# Altium footprint library 6-Connectors-4.PcbLib: 166 footprints (part 2 of 12) (continued)
## ERNI_064318 [mm] "12 Contacts Pitch 1.27  SMC Vertical Female Connector Type B" (continued)
  text "a6" at -3.925,2.35 h0.9
  text "b6" at -3.925,-3.575 h0.9
  text "b1" at 4.8,-3.275 h0.9
  text "a1" at 4.8,2.375 h0.9
Mechanical 8:
  lines w0.1: -6.685,-2.55 -5.685,-2.55 ; -6.685,2.55 -5.685,2.55 ; -6.385,0 -5.385,0 ; -5.685,-3.55 -5.685,-2.55 ; -5.685,-1.55 -5.685,-2.55 ; -5.685,1.55 -5.685,2.55 ; -5.685,3.55 -5.685,2.55 ; -5.385,-1 -5.385,0 ; -5.385,1 -5.385,0 ; -4.685,-2.55 -5.685,-2.55 ; -4.685,2.55 -5.685,2.55 ; -4.385,0 -5.385,0 ; -3.575,-3.3 -3.175,-2.75 ; -3.575,-2.2 -3.175,-2.75 ; -3.575,2.2 -3.175,2.75 ; -3.575,3.3 -3.175,2.75 ; -2.775,-3.3 -3.175,-2.75 ; -2.775,-2.2 -3.175,-2.75 ; -2.775,2.2 -3.175,2.75 ; -2.775,3.3 -3.175,2.75 ; -2.305,-3.3 -1.905,-2.75 ; -2.305,-2.2 -1.905,-2.75 ; -2.305,2.2 -1.905,2.75 ; -2.305,3.3 -1.905,2.75 ; -1.505,-3.3 -1.905,-2.75 ; -1.505,-2.2 -1.905,-2.75 ; -1.505,2.2 -1.905,2.75 ; -1.505,3.3 -1.905,2.75 ; -1.035,-3.3 -0.635,-2.75 ; -1.035,-2.2 -0.635,-2.75 ; -1.035,2.2 -0.635,2.75 ; -1.035,3.3 -0.635,2.75 ; -1,0 0,0 ; -0.235,-3.3 -0.635,-2.75 ; -0.235,-2.2 -0.635,-2.75 ; -0.235,2.2 -0.635,2.75 ; -0.235,3.3 -0.635,2.75 ; 0,-1 0,0 ; 0,1 0,0 ; 0.235,-3.3 0.635,-2.75 ; 0.235,-2.2 0.635,-2.75 ; 0.235,2.2 0.635,2.75 ; 0.235,3.3 0.635,2.75 ; 1,0 0,0 ; 1.035,-3.3 0.635,-2.75 ; 1.035,-2.2 0.635,-2.75 ; 1.035,2.2 0.635,2.75 ; 1.035,3.3 0.635,2.75 ; 1.505,-3.3 1.905,-2.75 ; 1.505,-2.2 1.905,-2.75 ; 1.505,2.2 1.905,2.75 ; 1.505,3.3 1.905,2.75 ; 2.305,-3.3 1.905,-2.75 ; 2.305,-2.2 1.905,-2.75 ; 2.305,2.2 1.905,2.75 ; 2.305,3.3 1.905,2.75 ; 2.775,-3.3 3.175,-2.75 ; 2.775,-2.2 3.175,-2.75 ; 2.775,2.2 3.175,2.75 ; 2.775,3.3 3.175,2.75 ; 3.575,-3.3 3.175,-2.75 ; 3.575,-2.2 3.175,-2.75 ; 3.575,2.2 3.175,2.75 ; 3.575,3.3 3.175,2.75 ; 4.385,0 5.385,0 ; 4.685,-2.55 5.685,-2.55 ; 4.685,2.55 5.685,2.55 ; 5.385,-1 5.385,0 ; 5.385,1 5.385,0 ; 5.685,-3.55 5.685,-2.55 ; 5.685,-1.55 5.685,-2.55 ; 5.685,1.55 5.685,2.55 ; 5.685,3.55 5.685,2.55 ; 6.385,0 5.385,0 ; 6.685,-2.55 5.685,-2.55 ; 6.685,2.55 5.685,2.55
Mechanical 14:
  drawing of 236 lines, arcs and shapes, not listed
  text "a6" at -3.925,2.35 h0.9
  text "b6" at -3.925,-3.575 h0.9
  text "b1" at 4.8,-3.275 h0.9
  text "a1" at 4.8,2.375 h0.9
Mechanical 15:
  lines w0.1: -6.285,-3.8 -6.285,-1.3 -5.085,-1.3 -5.085,-3.8 -6.285,-3.8 ; -6.285,1.3 -6.285,3.8 -5.085,3.8 -5.085,1.3 -6.285,1.3 ; -3.575,-3.3 -2.775,-3.3 -2.775,-2.2 -3.575,-2.2 -3.575,-3.3 ; -3.575,2.2 -2.775,2.2 -2.775,3.3 -3.575,3.3 -3.575,2.2 ; -2.305,-3.3 -1.505,-3.3 -1.505,-2.2 -2.305,-2.2 -2.305,-3.3 ; -2.305,2.2 -1.505,2.2 -1.505,3.3 -2.305,3.3 -2.305,2.2 ; -1.035,-3.3 -0.235,-3.3 -0.235,-2.2 -1.035,-2.2 -1.035,-3.3 ; -1.035,2.2 -0.235,2.2 -0.235,3.3 -1.035,3.3 -1.035,2.2 ; 0.235,-3.3 1.035,-3.3 1.035,-2.2 0.235,-2.2 0.235,-3.3 ; 0.235,2.2 1.035,2.2 1.035,3.3 0.235,3.3 0.235,2.2 ; 1.505,-3.3 2.305,-3.3 2.305,-2.2 1.505,-2.2 1.505,-3.3 ; 1.505,2.2 2.305,2.2 2.305,3.3 1.505,3.3 1.505,2.2 ; 2.775,-3.3 3.575,-3.3 3.575,-2.2 2.775,-2.2 2.775,-3.3 ; 2.775,2.2 2.775,3.3 3.575,3.3 3.575,2.2 2.775,2.2 ; 5.085,-3.8 5.085,-1.3 6.285,-1.3 6.285,-3.8 5.085,-3.8 ; 5.085,1.3 6.285,1.3 6.285,3.8 5.085,3.8 5.085,1.3
3D body "p250-120.stp": height 0.02, standoff 0, extent 5.085,-3.8 6.285,-1.3
3D body "p250-120.stp": height 0.02, standoff 0, extent 5.085,1.3 6.285,3.8
3D body "p250-120.stp": height 0.02, standoff 0, extent -6.285,-3.8 -5.085,-1.3
3D body "p250-120.stp": height 0.02, standoff 0, extent -6.285,1.3 -5.085,3.8
3D body "ERNI_064318.stp": height 6.25, standoff -0.75, extent -6.35,-3.6 6.35,3.6
3D body "p110-080.stp": height 0.02, standoff 0, extent -3.575,-3.3 -2.775,-2.2
3D body "p110-080.stp": height 0.02, standoff 0, extent -2.305,-3.3 -1.505,-2.2
3D body "p110-080.stp": height 0.02, standoff 0, extent -1.035,-3.3 -0.235,-2.2
3D body "p110-080.stp": height 0.02, standoff 0, extent 0.235,-3.3 1.035,-2.2
3D body "p110-080.stp": height 0.02, standoff 0, extent 1.505,-3.3 2.305,-2.2
3D body "p110-080.stp": height 0.02, standoff 0, extent 2.775,-3.3 3.575,-2.2
3D body "p110-080.stp": height 0.02, standoff 0, extent 2.775,2.2 3.575,3.3
3D body "p110-080.stp": height 0.02, standoff 0, extent 1.505,2.2 2.305,3.3
3D body "p110-080.stp": height 0.02, standoff 0, extent 0.235,2.2 1.035,3.3
3D body "p110-080.stp": height 0.02, standoff 0, extent -1.035,2.2 -0.235,3.3
3D body "p110-080.stp": height 0.02, standoff 0, extent -2.305,2.2 -1.505,3.3
3D body "p110-080.stp": height 0.02, standoff 0, extent -3.575,2.2 -2.775,3.3

## ERNI_064321 [mm] "12 Contacts Pitch 1.27  SMC Vertical Male Connector Type Q"
height 6.7
pads (18):
  rect 0.8x1.1 smd: A1(3.175,-2.75) A2(1.905,-2.75) A3(0.635,-2.75) A4(-0.635,-2.75) A5(-1.905,-2.75) A6(-3.175,-2.75) B1(3.175,2.75) B2(1.905,2.75) B3(0.635,2.75) B4(-0.635,2.75) B5(-1.905,2.75) B6(-3.175,2.75)
  rect 1.2x2.5 smd: Mec1(-5.685,2.55) Mec2(-5.685,-2.55) Mec3(5.685,2.55) Mec4(5.685,-2.55)
  round 1 hole 1.6 unplated mask+0.6: Mech5(-5.385,0) Mech6(5.385,0)
Top Overlay:
  circle w0.25: c3.175,3.766 r0.125
  lines w0.2: -4.785,0.8 -4.785,1.625 4.785,1.625 4.785,0.8 ; -4.685,-0.714 -4.685,-2.025 ; -4.396,-0.15 -4.285,-0.15 -4.285,-1.625 4.285,-1.625 ; -4.285,-1.625 -4.685,-2.025 ; -3.93,-2.025 -4.685,-2.025 ; 3.93,-2.025 4.685,-2.025 ; 4.396,-0.15 4.285,-0.15 4.285,-1.625 ; 4.685,-0.714 4.685,-2.025 ; 4.285,-1.625 4.685,-2.025 ; -3.385,-0.785 -2.965,-0.785 -2.965,-0.485 -3.385,-0.485 -3.385,-0.785 ; -3.385,0.485 -2.965,0.485 -2.965,0.785 -3.385,0.785 -3.385,0.485 ; -2.115,-0.785 -1.695,-0.785 -1.695,-0.485 -2.115,-0.485 -2.115,-0.785 ; -2.115,0.485 -1.695,0.485 -1.695,0.785 -2.115,0.785 -2.115,0.485 ; -0.845,-0.785 -0.425,-0.785 -0.425,-0.485 -0.845,-0.485 -0.845,-0.785 ; -0.845,0.485 -0.425,0.485 -0.425,0.785 -0.845,0.785 -0.845,0.485 ; 0.425,-0.785 0.845,-0.785 0.845,-0.485 0.425,-0.485 0.425,-0.785 ; 0.425,0.485 0.845,0.485 0.845,0.785 0.425,0.785 0.425,0.485 ; 1.695,-0.785 2.115,-0.785 2.115,-0.485 1.695,-0.485 1.695,-0.785 ; 1.695,0.485 2.115,0.485 2.115,0.785 1.695,0.785 1.695,0.485 ; 2.965,-0.785 3.385,-0.785 3.385,-0.485 2.965,-0.485 2.965,-0.785 ; 2.965,0.485 3.385,0.485 3.385,0.785 2.965,0.785 2.965,0.485
  text "b6" at -3.875,2.35 h0.9
  text "a6" at -3.875,-3.775 h0.9
  text "a1" at 4.775,-3.375 h0.9
  text "b1" at 4.8,2.375 h0.9
Mechanical 8:
  lines w0.1: -6.385,0 -5.385,0 ; -5.385,-1 -5.385,0 ; -5.385,1 -5.385,0 ; -4.385,0 -5.385,0 ; -3.575,-3.3 -3.175,-2.75 ; -3.575,-2.2 -3.175,-2.75 ; -3.575,2.2 -3.175,2.75 ; -3.575,3.3 -3.175,2.75 ; -2.775,-3.3 -3.175,-2.75 ; -2.775,-2.2 -3.175,-2.75 ; -2.775,2.2 -3.175,2.75 ; -2.775,3.3 -3.175,2.75 ; -2.305,-3.3 -1.905,-2.75 ; -2.305,-2.2 -1.905,-2.75 ; -2.305,2.2 -1.905,2.75 ; -2.305,3.3 -1.905,2.75 ; -1.505,-3.3 -1.905,-2.75 ; -1.505,-2.2 -1.905,-2.75 ; -1.505,2.2 -1.905,2.75 ; -1.505,3.3 -1.905,2.75 ; -1.035,-3.3 -0.635,-2.75 ; -1.035,-2.2 -0.635,-2.75 ; -1.035,2.2 -0.635,2.75 ; -1.035,3.3 -0.635,2.75 ; -1,0 0,0 ; -0.235,-3.3 -0.635,-2.75 ; -0.235,-2.2 -0.635,-2.75 ; -0.235,2.2 -0.635,2.75 ; -0.235,3.3 -0.635,2.75 ; 0,-1 0,0 ; 0,1 0,0 ; 0.235,-3.3 0.635,-2.75 ; 0.235,-2.2 0.635,-2.75 ; 0.235,2.2 0.635,2.75 ; 0.235,3.3 0.635,2.75 ; 1,0 0,0 ; 1.035,-3.3 0.635,-2.75 ; 1.035,-2.2 0.635,-2.75 ; 1.035,2.2 0.635,2.75 ; 1.035,3.3 0.635,2.75 ; 1.505,-3.3 1.905,-2.75 ; 1.505,-2.2 1.905,-2.75 ; 1.505,2.2 1.905,2.75 ; 1.505,3.3 1.905,2.75 ; 2.305,-3.3 1.905,-2.75 ; 2.305,-2.2 1.905,-2.75 ; 2.305,2.2 1.905,2.75 ; 2.305,3.3 1.905,2.75 ; 2.775,-3.3 3.175,-2.75 ; 2.775,-2.2 3.175,-2.75 ; 2.775,2.2 3.175,2.75 ; 2.775,3.3 3.175,2.75 ; 3.575,-3.3 3.175,-2.75 ; 3.575,-2.2 3.175,-2.75 ; 3.575,2.2 3.175,2.75 ; 3.575,3.3 3.175,2.75 ; 4.385,0 5.385,0 ; 5.385,-1 5.385,0 ; 5.385,1 5.385,0 ; 6.385,0 5.385,0
Mechanical 14:
  drawing of 180 lines, arcs and shapes, not listed
  text "b6" at -3.875,2.35 h0.9
  text "a6" at -3.875,-3.775 h0.9
  text "a1" at 4.775,-3.375 h0.9
  text "b1" at 4.8,2.375 h0.9
Mechanical 15:
  lines w0.1: -6.285,-3.8 -5.085,-3.8 -5.085,-1.3 -6.285,-1.3 -6.285,-3.8 ; -6.285,1.3 -5.085,1.3 -5.085,3.8 -6.285,3.8 -6.285,1.3 ; -3.575,-3.3 -3.575,-2.2 -2.775,-2.2 -2.775,-3.3 -3.575,-3.3 ; -3.575,2.2 -3.575,3.3 -2.775,3.3 -2.775,2.2 -3.575,2.2 ; -2.305,-3.3 -2.305,-2.2 -1.505,-2.2 -1.505,-3.3 -2.305,-3.3 ; -2.305,2.2 -2.305,3.3 -1.505,3.3 -1.505,2.2 -2.305,2.2 ; -1.035,-3.3 -1.035,-2.2 -0.235,-2.2 -0.235,-3.3 -1.035,-3.3 ; -1.035,2.2 -1.035,3.3 -0.235,3.3 -0.235,2.2 -1.035,2.2 ; 0.235,-3.3 0.235,-2.2 1.035,-2.2 1.035,-3.3 0.235,-3.3 ; 0.235,2.2 0.235,3.3 1.035,3.3 1.035,2.2 0.235,2.2 ; 1.505,-3.3 1.505,-2.2 2.305,-2.2 2.305,-3.3 1.505,-3.3 ; 1.505,2.2 1.505,3.3 2.305,3.3 2.305,2.2 1.505,2.2 ; 2.775,-3.3 2.775,-2.2 3.575,-2.2 3.575,-3.3 2.775,-3.3 ; 2.775,2.2 3.575,2.2 3.575,3.3 2.775,3.3 2.775,2.2 ; 5.085,-3.8 6.285,-3.8 6.285,-1.3 5.085,-1.3 5.085,-3.8 ; 5.085,1.3 5.085,3.8 6.285,3.8 6.285,1.3 5.085,1.3
3D body "p250-120.stp": height 0.02, standoff 0, extent 5.085,-3.8 6.285,-1.3
3D body "p250-120.stp": height 0.02, standoff 0, extent 5.085,1.3 6.285,3.8
3D body "p250-120.stp": height 0.02, standoff 0, extent -6.285,1.3 -5.085,3.8
3D body "p250-120.stp": height 0.02, standoff 0, extent -6.285,-3.8 -5.085,-1.3
3D body "p110-080.stp": height 0.02, standoff 0, extent -3.575,-3.3 -2.775,-2.2
3D body "p110-080.stp": height 0.02, standoff 0, extent -2.305,-3.3 -1.505,-2.2
3D body "p110-080.stp": height 0.02, standoff 0, extent -1.035,-3.3 -0.235,-2.2
3D body "p110-080.stp": height 0.02, standoff 0, extent 0.235,-3.3 1.035,-2.2
3D body "p110-080.stp": height 0.02, standoff 0, extent 1.505,-3.3 2.305,-2.2
3D body "p110-080.stp": height 0.02, standoff 0, extent 2.775,-3.3 3.575,-2.2
3D body "p110-080.stp": height 0.02, standoff 0, extent 2.775,2.2 3.575,3.3
3D body "p110-080.stp": height 0.02, standoff 0, extent 1.505,2.2 2.305,3.3
3D body "p110-080.stp": height 0.02, standoff 0, extent 0.235,2.2 1.035,3.3
3D body "p110-080.stp": height 0.02, standoff 0, extent -1.035,2.2 -0.235,3.3
3D body "p110-080.stp": height 0.02, standoff 0, extent -2.305,2.2 -1.505,3.3
3D body "p110-080.stp": height 0.02, standoff 0, extent -3.575,2.2 -2.775,3.3
3D body "ERNI_064321.stp": height 6.7, standoff -0.75, extent -6.35,-3.6 6.35,3.6

## HARWIN_D01-9922046 [mm] "20 Contact 2.54mm Pitch Single-In-Line Header Strip - Top Pin ?.46mm - Bottom Pin ?.69mm"
height 7.43
pads (20):
  round 1.6 hole 1: 1(0,0) 2(2.54,0) 3(5.08,0) 4(7.62,0) 5(10.16,0) 6(12.7,0) 7(15.24,0) 8(17.78,0) 9(20.32,0) 10(22.86,0) 11(25.4,0) 12(27.94,0) 13(30.48,0) 14(33.02,0) 15(35.56,0) 16(38.1,0) 17(40.64,0) 18(43.18,0) 19(45.72,0) 20(48.26,0)
Top Overlay:
  drawing of 160 lines, arcs and shapes, not listed
Mechanical 8:
  lines w0.1: -0.8,0 0,0 ; 0,-0.8 0,0 ; 0,0.8 0,0 ; 0.8,0 0,0 ; 1.74,0 2.54,0 ; 2.54,-0.8 2.54,0 ; 2.54,0.8 2.54,0 ; 3.34,0 2.54,0 ; 4.28,0 5.08,0 ; 5.08,-0.8 5.08,0 ; 5.08,0.8 5.08,0 ; 5.88,0 5.08,0 ; 6.82,0 7.62,0 ; 7.62,-0.8 7.62,0 ; 7.62,0.8 7.62,0 ; 8.42,0 7.62,0 ; 9.36,0 10.16,0 ; 10.16,-0.8 10.16,0 ; 10.16,0.8 10.16,0 ; 10.96,0 10.16,0 ; 11.9,0 12.7,0 ; 12.7,-0.8 12.7,0 ; 12.7,0.8 12.7,0 ; 13.5,0 12.7,0 ; 14.44,0 15.24,0 ; 15.24,-0.8 15.24,0 ; 15.24,0.8 15.24,0 ; 16.04,0 15.24,0 ; 16.98,0 17.78,0 ; 17.78,-0.8 17.78,0 ; 17.78,0.8 17.78,0 ; 18.58,0 17.78,0 ; 19.52,0 20.32,0 ; 20.32,-0.8 20.32,0 ; 20.32,0.8 20.32,0 ; 21.12,0 20.32,0 ; 22.06,0 22.86,0 ; 22.86,-0.8 22.86,0 ; 22.86,0.8 22.86,0 ; 23.66,0 22.86,0 ; 24.6,0 25.4,0 ; 25.4,-0.8 25.4,0 ; 25.4,0.8 25.4,0 ; 26.2,0 25.4,0 ; 27.14,0 27.94,0 ; 27.94,-0.8 27.94,0 ; 27.94,0.8 27.94,0 ; 28.74,0 27.94,0 ; 29.68,0 30.48,0 ; 30.48,-0.8 30.48,0 ; 30.48,0.8 30.48,0 ; 31.28,0 30.48,0 ; 32.22,0 33.02,0 ; 33.02,-0.8 33.02,0 ; 33.02,0.8 33.02,0 ; 33.82,0 33.02,0 ; 34.76,0 35.56,0 ; 35.56,-0.8 35.56,0 ; 35.56,0.8 35.56,0 ; 36.36,0 35.56,0 ; 37.3,0 38.1,0 ; 38.1,-0.8 38.1,0 ; 38.1,0.8 38.1,0 ; 38.9,0 38.1,0 ; 39.84,0 40.64,0 ; 40.64,-0.8 40.64,0 ; 40.64,0.8 40.64,0 ; 41.44,0 40.64,0 ; 42.38,0 43.18,0 ; 43.18,-0.8 43.18,0 ; 43.18,0.8 43.18,0 ; 43.98,0 43.18,0 ; 44.92,0 45.72,0 ; 45.72,-0.8 45.72,0 ; 45.72,0.8 45.72,0 ; 46.52,0 45.72,0 ; 47.46,0 48.26,0 ; 48.26,-0.8 48.26,0 ; 48.26,0.8 48.26,0 ; 49.06,0 48.26,0
Mechanical 14:
  drawing of 160 lines, arcs and shapes, not listed
3D body "HARWIN_D01-9922046.stp": height 7.43, standoff -4.3, extent -1.27,-1.27 49.53,1.27

## HARWIN_D01-9922046_8OF20 [mm] "8 of 20 Contact 2.54mm Pitch Single-In-Line Header Strip - Top Pin ?.46mm - Bottom Pin ?.69mm"
height 7.43
pads (8):
  round 1.6 hole 1: 1(0,0) 2(2.54,0) 3(5.08,0) 4(7.62,0) 5(10.16,0) 6(12.7,0) 7(15.24,0) 8(17.78,0)
Top Overlay:
  lines w0.2: 1.27,-0.77 1.77,-1.27 3.31,-1.27 3.81,-0.77 ; 1.27,-0.77 1.27,0.77 ; 1.27,-0.77 1.27,0.77 ; 1.27,-0.77 0.77,-1.27 -0.77,-1.27 -1.27,-0.77 -1.27,0.77 -0.77,1.27 0.77,1.27 1.27,0.77 ; 1.27,0.77 1.77,1.27 3.31,1.27 3.81,0.77 ; 3.81,-0.77 4.31,-1.27 5.85,-1.27 6.35,-0.77 ; 3.81,-0.77 3.81,0.77 ; 3.81,-0.77 3.81,0.77 ; 3.81,0.77 4.31,1.27 5.85,1.27 6.35,0.77 ; 6.35,-0.77 6.85,-1.27 8.39,-1.27 8.89,-0.77 ; 6.35,-0.77 6.35,0.77 ; 6.35,-0.77 6.35,0.77 ; 6.35,0.77 6.85,1.27 8.39,1.27 8.89,0.77 ; 8.89,-0.77 9.39,-1.27 10.93,-1.27 11.43,-0.77 ; 8.89,-0.77 8.89,0.77 ; 8.89,-0.77 8.89,0.77 ; 8.89,0.77 9.39,1.27 10.93,1.27 11.43,0.77 ; 11.43,-0.77 11.93,-1.27 13.47,-1.27 13.97,-0.77 ; 11.43,-0.77 11.43,0.77 ; 11.43,-0.77 11.43,0.77 ; 11.43,0.77 11.93,1.27 13.47,1.27 13.97,0.77 ; 13.97,-0.77 14.47,-1.27 16.01,-1.27 16.51,-0.77 ; 13.97,-0.77 13.97,0.77 ; 13.97,-0.77 13.97,0.77 ; 13.97,0.77 14.47,1.27 16.01,1.27 16.51,0.77 ; 16.51,-0.77 17.01,-1.27 18.55,-1.27 19.05,-0.77 19.05,0.77 18.55,1.27 17.01,1.27 16.51,0.77 ; 16.51,-0.77 16.51,0.77 ; 16.51,-0.77 16.51,0.77
Mechanical 8:
  lines w0.1: -0.8,0 0,0 ; 0,-0.8 0,0 ; 0,0.8 0,0 ; 0.8,0 0,0 ; 1.74,0 2.54,0 ; 2.54,-0.8 2.54,0 ; 2.54,0.8 2.54,0 ; 3.34,0 2.54,0 ; 4.28,0 5.08,0 ; 5.08,-0.8 5.08,0 ; 5.08,0.8 5.08,0 ; 5.88,0 5.08,0 ; 6.82,0 7.62,0 ; 7.62,-0.8 7.62,0 ; 7.62,0.8 7.62,0 ; 8.42,0 7.62,0 ; 9.36,0 10.16,0 ; 10.16,-0.8 10.16,0 ; 10.16,0.8 10.16,0 ; 10.96,0 10.16,0 ; 11.9,0 12.7,0 ; 12.7,-0.8 12.7,0 ; 12.7,0.8 12.7,0 ; 13.5,0 12.7,0 ; 14.44,0 15.24,0 ; 15.24,-0.8 15.24,0 ; 15.24,0.8 15.24,0 ; 16.04,0 15.24,0 ; 16.98,0 17.78,0 ; 17.78,-0.8 17.78,0 ; 17.78,0.8 17.78,0 ; 18.58,0 17.78,0
Mechanical 14:
  lines w0.1: 1.27,-0.77 1.77,-1.27 3.31,-1.27 3.81,-0.77 ; 1.27,-0.77 1.27,0.77 ; 1.27,-0.77 1.27,0.77 ; 1.27,-0.77 0.77,-1.27 -0.77,-1.27 -1.27,-0.77 -1.27,0.77 -0.77,1.27 0.77,1.27 1.27,0.77 ; 1.27,0.77 1.77,1.27 3.31,1.27 3.81,0.77 ; 3.81,-0.77 4.31,-1.27 5.85,-1.27 6.35,-0.77 ; 3.81,-0.77 3.81,0.77 ; 3.81,-0.77 3.81,0.77 ; 3.81,0.77 4.31,1.27 5.85,1.27 6.35,0.77 ; 6.35,-0.77 6.85,-1.27 8.39,-1.27 8.89,-0.77 ; 6.35,-0.77 6.35,0.77 ; 6.35,-0.77 6.35,0.77 ; 6.35,0.77 6.85,1.27 8.39,1.27 8.89,0.77 ; 8.89,-0.77 9.39,-1.27 10.93,-1.27 11.43,-0.77 ; 8.89,-0.77 8.89,0.77 ; 8.89,-0.77 8.89,0.77 ; 8.89,0.77 9.39,1.27 10.93,1.27 11.43,0.77 ; 11.43,-0.77 11.93,-1.27 13.47,-1.27 13.97,-0.77 ; 11.43,-0.77 11.43,0.77 ; 11.43,-0.77 11.43,0.77 ; 11.43,0.77 11.93,1.27 13.47,1.27 13.97,0.77 ; 13.97,-0.77 14.47,-1.27 16.01,-1.27 16.51,-0.77 ; 13.97,-0.77 13.97,0.77 ; 13.97,-0.77 13.97,0.77 ; 13.97,0.77 14.47,1.27 16.01,1.27 16.51,0.77 ; 16.51,-0.77 17.01,-1.27 18.55,-1.27 19.05,-0.77 19.05,0.77 18.55,1.27 17.01,1.27 16.51,0.77 ; 16.51,-0.77 16.51,0.77 ; 16.51,-0.77 16.51,0.77
3D body "HARWIN_D01-9922046_8OF20.stp": height 7.43, standoff -4.3, extent -1.27,-1.27 19.05,1.27

## HARWIN_M20-6112045 [mm] "40 Ways, Dual Row, 2.54mm Pitch, PC/104 Non-Stackthrough Connector"
height 11.05
pads (40):
  round 1.7 hole 1: 1(-24.13,1.27) 2(-24.13,-1.27) 3(-21.59,1.27) 4(-21.59,-1.27) 5(-19.05,1.27) 6(-19.05,-1.27) 7(-16.51,1.27) 8(-16.51,-1.27) 9(-13.97,1.27) 10(-13.97,-1.27) 11(-11.43,1.27) 12(-11.43,-1.27) 13(-8.89,1.27) 14(-8.89,-1.27) 15(-6.35,1.27) 16(-6.35,-1.27) 17(-3.81,1.27) 18(-3.81,-1.27) 19(-1.27,1.27) 20(-1.27,-1.27) 21(1.27,1.27) 22(1.27,-1.27) 23(3.81,1.27) 24(3.81,-1.27) 25(6.35,1.27) 26(6.35,-1.27) 27(8.89,1.27) 28(8.89,-1.27) 29(11.43,1.27) 30(11.43,-1.27) 31(13.97,1.27) 32(13.97,-1.27) 33(16.51,1.27) 34(16.51,-1.27) 35(19.05,1.27) 36(19.05,-1.27) 37(21.59,1.27) 38(21.59,-1.27) 39(24.13,1.27) 40(24.13,-1.27)
Top Overlay:
  circle w0.3: c-24.175,3.125 r0.15
  lines w0.2: -25.91,-2.625 25.91,-2.625 25.91,2.625 -25.91,2.625 -25.91,-2.625
Mechanical 8:
  drawing of 164 lines, arcs and shapes, not listed
Mechanical 14:
  drawing of 485 lines, arcs and shapes, not listed
3D body "HARWIN_M20-6112045.stp": height 11.05, standoff -2.29, extent -25.91,-2.625 25.91,2.625

## HARWIN_M20-7830546 [mm] "10 Contacts, Pitch 2.54mm - Top Entry, Dual Row, Through Mount Socket"
height 8.5
pads (10):
  round 1.7 hole 1: 1(-5.08,1.27) 2(-5.08,-1.27) 3(-2.54,1.27) 4(-2.54,-1.27) 5(0,1.27) 6(0,-1.27) 7(2.54,1.27) 8(2.54,-1.27) 9(5.08,1.27) 10(5.08,-1.27)
Top Overlay:
  circle w0.3: c-5.115,2.935 r0.15
  lines w0.2: -6.55,-2.5 -6.55,2.5 6.55,2.5 6.55,-2.5 -6.55,-2.5
  text "1" at -7.127,0.772 h1
  text "10" at 6.85,-1.85 h1
Mechanical 8:
  lines w0.1: -5.58,-1.27 -5.08,-1.27 ; -5.58,1.27 -5.08,1.27 ; -5.08,-1.77 -5.08,-1.27 ; -5.08,-0.77 -5.08,-1.27 ; -5.08,0.77 -5.08,1.27 ; -5.08,1.77 -5.08,1.27 ; -4.58,-1.27 -5.08,-1.27 ; -4.58,1.27 -5.08,1.27 ; -3.04,-1.27 -2.54,-1.27 ; -3.04,1.27 -2.54,1.27 ; -2.54,-1.77 -2.54,-1.27 ; -2.54,-0.77 -2.54,-1.27 ; -2.54,0.77 -2.54,1.27 ; -2.54,1.77 -2.54,1.27 ; -2.04,-1.27 -2.54,-1.27 ; -2.04,1.27 -2.54,1.27 ; -0.5,-1.27 0,-1.27 ; -0.5,0 0,0 ; -0.5,1.27 0,1.27 ; 0,-1.77 0,-1.27 ; 0,-0.77 0,-1.27 ; 0,-0.5 0,0 ; 0,0.5 0,0 ; 0,0.77 0,1.27 ; 0,1.77 0,1.27 ; 0.5,-1.27 0,-1.27 ; 0.5,0 0,0 ; 0.5,1.27 0,1.27 ; 2.04,-1.27 2.54,-1.27 ; 2.04,1.27 2.54,1.27 ; 2.54,-1.77 2.54,-1.27 ; 2.54,-0.77 2.54,-1.27 ; 2.54,0.77 2.54,1.27 ; 2.54,1.77 2.54,1.27 ; 3.04,-1.27 2.54,-1.27 ; 3.04,1.27 2.54,1.27 ; 4.58,-1.27 5.08,-1.27 ; 4.58,1.27 5.08,1.27 ; 5.08,-1.77 5.08,-1.27 ; 5.08,-0.77 5.08,-1.27 ; 5.08,0.77 5.08,1.27 ; 5.08,1.77 5.08,1.27 ; 5.58,-1.27 5.08,-1.27 ; 5.58,1.27 5.08,1.27
Mechanical 14:
  circle w0.3: c-5.115,2.935 r0.15
  lines w0.1: -5.48,-0.873 -5.98,-0.37 ; -5.48,1.667 -5.98,2.17 ; -2.94,-0.873 -3.44,-0.37 ; -2.94,1.667 -3.44,2.17 ; -0.4,-0.873 -0.9,-0.37 ; -0.4,1.667 -0.9,2.17 ; 2.14,-0.873 1.64,-0.37 ; 2.14,1.667 1.64,2.17 ; 4.68,-0.873 4.18,-0.37 ; 4.68,1.667 4.18,2.17 ; -5.98,-2.17 -5.98,-0.37 ; -5.98,-2.17 -4.18,-2.17 ; -5.98,-2.17 -5.48,-1.67 ; -5.98,-0.37 -4.18,-0.37 ; -5.98,0.37 -5.98,2.17 ; -5.98,0.37 -4.18,0.37 ; -5.98,0.37 -5.48,0.87 ; -5.98,2.17 -4.18,2.17 ; -5.48,-1.67 -4.68,-1.67 ; -5.48,-1.67 -5.48,-0.87 -4.68,-0.87 ; -5.48,0.87 -4.68,0.87 ; -5.48,0.87 -5.48,1.67 -4.68,1.67 ; -4.68,-1.67 -4.18,-2.17 ; -4.68,-1.67 -4.68,-0.87 ; -4.68,-0.87 -4.18,-0.37 ; -4.68,0.87 -4.18,0.37 ; -4.68,0.87 -4.68,1.67 ; -4.68,1.67 -4.18,2.17 ; -4.18,-2.17 -4.18,-0.37 ; -4.18,0.37 -4.18,2.17 ; -3.44,-2.17 -3.44,-0.37 ; -3.44,-2.17 -1.64,-2.17 ; -3.44,-2.17 -2.94,-1.67 ; -3.44,-0.37 -1.64,-0.37 ; -3.44,0.37 -3.44,2.17 ; -3.44,0.37 -1.64,0.37 ; -3.44,0.37 -2.94,0.87 ; -3.44,2.17 -1.64,2.17 ; -2.94,-1.67 -2.14,-1.67 ; -2.94,-1.67 -2.94,-0.87 -2.14,-0.87 ; -2.94,0.87 -2.14,0.87 ; -2.94,0.87 -2.94,1.67 -2.14,1.67 ; -2.14,-1.67 -1.64,-2.17 ; -2.14,-1.67 -2.14,-0.87 ; -2.14,-0.87 -1.64,-0.37 ; -2.14,0.87 -1.64,0.37 ; -2.14,0.87 -2.14,1.67 ; -2.14,1.67 -1.64,2.17 ; -1.64,-2.17 -1.64,-0.37 ; -1.64,0.37 -1.64,2.17 ; -0.9,-2.17 -0.9,-0.37 ; -0.9,-2.17 0.9,-2.17 ; -0.9,-2.17 -0.4,-1.67 ; -0.9,-0.37 0.9,-0.37 ; -0.9,0.37 -0.9,2.17 ; -0.9,0.37 0.9,0.37 ; -0.9,0.37 -0.4,0.87 ; -0.9,2.17 0.9,2.17 ; -0.4,-1.67 0.4,-1.67 ; -0.4,-1.67 -0.4,-0.87 0.4,-0.87 ; -0.4,0.87 0.4,0.87 ; -0.4,0.87 -0.4,1.67 0.4,1.67 ; 0.4,-1.67 0.9,-2.17 ; 0.4,-1.67 0.4,-0.87 ; 0.4,-0.87 0.9,-0.37 ; 0.4,0.87 0.9,0.37 ; 0.4,0.87 0.4,1.67 ; 0.4,1.67 0.9,2.17 ; 0.9,-2.17 0.9,-0.37 ; 0.9,0.37 0.9,2.17 ; 1.64,-2.17 1.64,-0.37 ; 1.64,-2.17 3.44,-2.17 ; 1.64,-2.17 2.14,-1.67 ; 1.64,-0.37 3.44,-0.37 ; 1.64,0.37 1.64,2.17 ; 1.64,0.37 3.44,0.37 ; 1.64,0.37 2.14,0.87 ; 1.64,2.17 3.44,2.17 ; 2.14,-1.67 2.94,-1.67 ; 2.14,-1.67 2.14,-0.87 2.94,-0.87 ; 2.14,0.87 2.94,0.87 ; 2.14,0.87 2.14,1.67 2.94,1.67 ; 2.94,-1.67 3.44,-2.17 ; 2.94,-1.67 2.94,-0.87 ; 2.94,-0.87 3.44,-0.37 ; 2.94,0.87 3.44,0.37 ; 2.94,0.87 2.94,1.67 ; 2.94,1.67 3.44,2.17 ; 3.44,-2.17 3.44,-0.37 ; 3.44,0.37 3.44,2.17 ; 4.18,-2.17 4.18,-0.37 ; 4.18,-2.17 5.98,-2.17 ; 4.18,-2.17 4.68,-1.67 ; 4.18,-0.37 5.98,-0.37 ; 4.18,0.37 4.18,2.17 ; 4.18,0.37 5.98,0.37 ; 4.18,0.37 4.68,0.87 ; 4.18,2.17 5.98,2.17 ; 4.68,-1.67 5.48,-1.67 ; 4.68,-1.67 4.68,-0.87 5.48,-0.87 ; 4.68,0.87 5.48,0.87 ; 4.68,0.87 4.68,1.67 5.48,1.67 ; 5.48,-1.67 5.98,-2.17 ; 5.48,-1.67 5.48,-0.87 ; 5.48,-0.87 5.98,-0.37 ; 5.48,0.87 5.98,0.37 ; 5.48,0.87 5.48,1.67 ; 5.48,1.67 5.98,2.17 ; 5.98,-2.17 5.98,-0.37 ; 5.98,0.37 5.98,2.17 ; -6.55,-2.5 -6.55,2.5 6.55,2.5 6.55,-2.5 -6.55,-2.5
  text "1" at -7.127,0.772 h1
  text "10" at 6.85,-1.85 h1
3D body "HARWIN_M20-7830546.stp": height 8.5, standoff -3, extent -6.55,-2.5 6.55,2.5

## HARWIN_M20-9990246 [mm] "2 Contacts, Pitch 2.54mm - Male Vertical Single row Pc tail"
height 8.68
pads (2):
  round 1.7 hole 1: 1(0,0) 2(2.54,0)
Top Overlay:
  circle w0.3: c-0.508,1.778 r0.15
  lines w0.2: 1.27,-0.77 1.77,-1.27 3.31,-1.27 3.81,-0.77 3.81,0.77 3.31,1.27 1.77,1.27 1.27,0.77 ; 1.27,-0.77 0.77,-1.27 -0.77,-1.27 -1.27,-0.77 -1.27,0.77 -0.77,1.27 0.77,1.27 1.27,0.77 ; 1.27,-0.77 1.27,0.77
Mechanical 8:
  lines w0.1: -0.5,0 0,0 ; 0,-0.5 0,0 ; 0,0.5 0,0 ; 0.5,0 0,0 ; 2.04,0 2.54,0 ; 2.54,-0.5 2.54,0 ; 2.54,0.5 2.54,0 ; 3.04,0 2.54,0
Mechanical 14:
  circle w0.3: c-0.508,1.778 r0.15
  lines w0.1: 1.27,-0.77 1.77,-1.27 3.31,-1.27 3.81,-0.77 3.81,0.77 3.31,1.27 1.77,1.27 1.27,0.77 ; 1.27,-0.77 0.77,-1.27 -0.77,-1.27 -1.27,-0.77 -1.27,0.77 -0.77,1.27 0.77,1.27 1.27,0.77 ; 1.27,-0.77 1.27,0.77
3D body "HARWIN_M20-9990246.stp": height 8.64, standoff -3.04, extent -1.27,-1.27 3.81,1.27